# Altium schematic symbol library jlcpcb_2025_04_capacitors_extended_0201.schlib: 1175 symbols (part 2 of 7) (continued)
## CC0201KRX7R6BB103
designator C?  Capacitance: 10nF  (hidden comment: *)
Capacitor, Ceramic (MLCC), 10nF, ±10%, 10V, X7R, ±10%, SMD 0201; Manufacturer: YAGEO; Manufacturer Part Number: CC0201KRX7R6BB103; Package Size: 0201; JLCPCB Basic Part: No; JLCPCB Part Number: C541216; Supplier 1: LCSC; Category: Capacitors - MLCC; Supplier Part Number 1: C541216; Tolerance: ±10%; Voltage Rating: 10V; Temperature Coefficient: X7R; RoHS: Yes; ComponentLink1Description: Datasheet; ComponentLink1URL: https://wmsc.lcsc.com/wmsc/upload/file/pdf/v2/lcsc/2006151109_YAGEO-CC0201KRX7R6BB103_C541216.pdf; ComponentLink2Description: JLCPCB Part URL; ComponentLink2URL: https://jlcpcb.com/partdetail/C541216; ComponentLink3Description: LCSC Part URL; ComponentLink3URL: https://lcsc.com/product-detail/Multilayer-Ceramic-Capacitors-MLCC---SMD-SMT_YAGEO-YAGEO-CC0201KRX7R6BB103_C541216.html
footprint CAP-0201 (0201 (0603M) Capacitor)
pins: 1, 2

## CC0201KRX7R6BB152
designator C?  Capacitance: 1.5nF  (hidden comment: *)
Capacitor, Ceramic (MLCC), 1.5nF, ±10%, 10V, X7R, ±10%, SMD 0201; Manufacturer: YAGEO; Manufacturer Part Number: CC0201KRX7R6BB152; Package Size: 0201; JLCPCB Basic Part: No; JLCPCB Part Number: C541227; Supplier 1: LCSC; Category: Capacitors - MLCC; Supplier Part Number 1: C541227; Tolerance: ±10%; Voltage Rating: 10V; Temperature Coefficient: X7R; RoHS: Yes; ComponentLink1Description: Datasheet; ComponentLink1URL: https://wmsc.lcsc.com/wmsc/upload/file/pdf/v2/lcsc/2006151109_YAGEO-CC0201KRX7R6BB152_C541227.pdf; ComponentLink2Description: JLCPCB Part URL; ComponentLink2URL: https://jlcpcb.com/partdetail/C541227; ComponentLink3Description: LCSC Part URL; ComponentLink3URL: https://lcsc.com/product-detail/Multilayer-Ceramic-Capacitors-MLCC---SMD-SMT_YAGEO-YAGEO-CC0201KRX7R6BB152_C541227.html
footprint CAP-0201 (0201 (0603M) Capacitor)
pins: 1, 2

## CC0201KRX7R6BB332
designator C?  Capacitance: 3.3nF  (hidden comment: *)
Capacitor, Ceramic (MLCC), 3.3nF, ±10%, 10V, X7R, ±10%, SMD 0201; Manufacturer: YAGEO; Manufacturer Part Number: CC0201KRX7R6BB332; Package Size: 0201; JLCPCB Basic Part: No; JLCPCB Part Number: C526952; Supplier 1: LCSC; Category: Capacitors - MLCC; Supplier Part Number 1: C526952; Tolerance: ±10%; Voltage Rating: 10V; Temperature Coefficient: X7R; RoHS: Yes; ComponentLink1Description: Datasheet; ComponentLink1URL: https://wmsc.lcsc.com/wmsc/upload/file/pdf/v2/lcsc/2007091834_YAGEO-CC0201KRX7R6BB332_C526952.pdf; ComponentLink2Description: JLCPCB Part URL; ComponentLink2URL: https://jlcpcb.com/partdetail/C526952; ComponentLink3Description: LCSC Part URL; ComponentLink3URL: https://lcsc.com/product-detail/Multilayer-Ceramic-Capacitors-MLCC---SMD-SMT_YAGEO-YAGEO-CC0201KRX7R6BB332_C526952.html
footprint CAP-0201 (0201 (0603M) Capacitor)
pins: 1, 2

## CC0201KRX7R6BB392
designator C?  Capacitance: 3.9nF  (hidden comment: *)
Capacitor, Ceramic (MLCC), 3.9nF, ±10%, 10V, X7R, ±10%, SMD 0201; Manufacturer: YAGEO; Manufacturer Part Number: CC0201KRX7R6BB392; Package Size: 0201; JLCPCB Basic Part: No; JLCPCB Part Number: C526953; Supplier 1: LCSC; Category: Capacitors - MLCC; Supplier Part Number 1: C526953; Tolerance: ±10%; Voltage Rating: 10V; Temperature Coefficient: X7R; RoHS: Yes; ComponentLink1Description: Datasheet; ComponentLink1URL: https://wmsc.lcsc.com/wmsc/upload/file/pdf/v2/lcsc/2009180902_YAGEO-CC0201KRX7R6BB392_C526953.pdf; ComponentLink2Description: JLCPCB Part URL; ComponentLink2URL: https://jlcpcb.com/partdetail/C526953; ComponentLink3Description: LCSC Part URL; ComponentLink3URL: https://lcsc.com/product-detail/Multilayer-Ceramic-Capacitors-MLCC---SMD-SMT_YAGEO-YAGEO-CC0201KRX7R6BB392_C526953.html
footprint CAP-0201 (0201 (0603M) Capacitor)
pins: 1, 2

## CC0201KRX7R7BB102
designator C?  Capacitance: 1nF  (hidden comment: *)
Capacitor, Ceramic (MLCC), 1nF, ±10%, 16V, X7R, ±10%, SMD 0201; Manufacturer: YAGEO; Manufacturer Part Number: CC0201KRX7R7BB102; Package Size: 0201; JLCPCB Basic Part: No; JLCPCB Part Number: C541217; Supplier 1: LCSC; Category: Capacitors - MLCC; Supplier Part Number 1: C541217; Tolerance: ±10%; Voltage Rating: 16V; Temperature Coefficient: X7R; RoHS: Yes; ComponentLink1Description: Datasheet; ComponentLink1URL: https://wmsc.lcsc.com/wmsc/upload/file/pdf/v2/lcsc/2006151109_YAGEO-CC0201KRX7R7BB102_C541217.pdf; ComponentLink2Description: JLCPCB Part URL; ComponentLink2URL: https://jlcpcb.com/partdetail/C541217; ComponentLink3Description: LCSC Part URL; ComponentLink3URL: https://lcsc.com/product-detail/Multilayer-Ceramic-Capacitors-MLCC---SMD-SMT_YAGEO-YAGEO-CC0201KRX7R7BB102_C541217.html
footprint CAP-0201 (0201 (0603M) Capacitor)
pins: 1, 2

## CC0201KRX7R7BB103
designator C?  Capacitance: 10nF  (hidden comment: *)
Capacitor, Ceramic (MLCC), 10nF, ±10%, 16V, X7R, ±10%, SMD 0201; Manufacturer: YAGEO; Manufacturer Part Number: CC0201KRX7R7BB103; Package Size: 0201; JLCPCB Basic Part: No; JLCPCB Part Number: C272853; Supplier 1: LCSC; Category: Capacitors - MLCC; Supplier Part Number 1: C272853; Tolerance: ±10%; Voltage Rating: 16V; Temperature Coefficient: X7R; RoHS: Yes; ComponentLink1Description: Datasheet; ComponentLink1URL: https://wmsc.lcsc.com/wmsc/upload/file/pdf/v2/lcsc/2304140030_YAGEO-CC0201KRX7R7BB103_C272853.pdf; ComponentLink2Description: JLCPCB Part URL; ComponentLink2URL: https://jlcpcb.com/partdetail/C272853; ComponentLink3Description: LCSC Part URL; ComponentLink3URL: https://lcsc.com/product-detail/Multilayer-Ceramic-Capacitors-MLCC---SMD-SMT_YAGEO-YAGEO-CC0201KRX7R7BB103_C272853.html
footprint CAP-0201 (0201 (0603M) Capacitor)
pins: 1, 2

## CC0201KRX7R7BB272
designator C?  Capacitance: 2.7nF  (hidden comment: *)
Capacitor, Ceramic (MLCC), 2.7nF, ±10%, 16V, X7R, ±10%, SMD 0201; Manufacturer: YAGEO; Manufacturer Part Number: CC0201KRX7R7BB272; Package Size: 0201; JLCPCB Basic Part: No; JLCPCB Part Number: C327026; Supplier 1: LCSC; Category: Capacitors - MLCC; Supplier Part Number 1: C327026; Tolerance: ±10%; Voltage Rating: 16V; Temperature Coefficient: X7R; RoHS: Yes; ComponentLink1Description: Datasheet; ComponentLink1URL: https://wmsc.lcsc.com/wmsc/upload/file/pdf/v2/lcsc/1811061214_YAGEO-CC0201KRX7R7BB272_C327026.pdf; ComponentLink2Description: JLCPCB Part URL; ComponentLink2URL: https://jlcpcb.com/partdetail/C327026; ComponentLink3Description: LCSC Part URL; ComponentLink3URL: https://lcsc.com/product-detail/Multilayer-Ceramic-Capacitors-MLCC---SMD-SMT_YAGEO-YAGEO-CC0201KRX7R7BB272_C327026.html
footprint CAP-0201 (0201 (0603M) Capacitor)
pins: 1, 2

## CC0201KRX7R7BB331
designator C?  Capacitance: 330pF  (hidden comment: *)
Capacitor, Ceramic (MLCC), 330pF, ±10%, 16V, X7R, ±10%, SMD 0201; Manufacturer: YAGEO; Manufacturer Part Number: CC0201KRX7R7BB331; Package Size: 0201; JLCPCB Basic Part: No; JLCPCB Part Number: C541229; Supplier 1: LCSC; Category: Capacitors - MLCC; Supplier Part Number 1: C541229; Tolerance: ±10%; Voltage Rating: 16V; Temperature Coefficient: X7R; RoHS: Yes; ComponentLink1Description: Datasheet; ComponentLink1URL: https://wmsc.lcsc.com/wmsc/upload/file/pdf/v2/lcsc/2006151109_YAGEO-CC0201KRX7R7BB331_C541229.pdf; ComponentLink2Description: JLCPCB Part URL; ComponentLink2URL: https://jlcpcb.com/partdetail/C541229; ComponentLink3Description: LCSC Part URL; ComponentLink3URL: https://lcsc.com/product-detail/Multilayer-Ceramic-Capacitors-MLCC---SMD-SMT_YAGEO-YAGEO-CC0201KRX7R7BB331_C541229.html
footprint CAP-0201 (0201 (0603M) Capacitor)
pins: 1, 2

## CC0201KRX7R7BB392
designator C?  Capacitance: 3.9nF  (hidden comment: *)
Capacitor, Ceramic (MLCC), 3.9nF, ±10%, 16V, X7R, ±10%, SMD 0201; Manufacturer: YAGEO; Manufacturer Part Number: CC0201KRX7R7BB392; Package Size: 0201; JLCPCB Basic Part: No; JLCPCB Part Number: C541230; Supplier 1: LCSC; Category: Capacitors - MLCC; Supplier Part Number 1: C541230; Tolerance: ±10%; Voltage Rating: 16V; Temperature Coefficient: X7R; RoHS: Yes; ComponentLink1Description: Datasheet; ComponentLink1URL: https://wmsc.lcsc.com/wmsc/upload/file/pdf/v2/lcsc/2006151109_YAGEO-CC0201KRX7R7BB392_C541230.pdf; ComponentLink2Description: JLCPCB Part URL; ComponentLink2URL: https://jlcpcb.com/partdetail/C541230; ComponentLink3Description: LCSC Part URL; ComponentLink3URL: https://lcsc.com/product-detail/Multilayer-Ceramic-Capacitors-MLCC---SMD-SMT_YAGEO-YAGEO-CC0201KRX7R7BB392_C541230.html
footprint CAP-0201 (0201 (0603M) Capacitor)
pins: 1, 2

## CC0201KRX7R7BB472
designator C?  Capacitance: 4.7nF  (hidden comment: *)
Capacitor, Ceramic (MLCC), 4.7nF, ±10%, 16V, X7R, ±10%, SMD 0201; Manufacturer: YAGEO; Manufacturer Part Number: CC0201KRX7R7BB472; Package Size: 0201; JLCPCB Basic Part: No; JLCPCB Part Number: C526960; Supplier 1: LCSC; Category: Capacitors - MLCC; Supplier Part Number 1: C526960; Tolerance: ±10%; Voltage Rating: 16V; Temperature Coefficient: X7R; RoHS: Yes; ComponentLink1Description: Datasheet; ComponentLink1URL: https://wmsc.lcsc.com/wmsc/upload/file/pdf/v2/lcsc/2005222138_YAGEO-CC0201KRX7R7BB472_C526960.pdf; ComponentLink2Description: JLCPCB Part URL; ComponentLink2URL: https://jlcpcb.com/partdetail/C526960; ComponentLink3Description: LCSC Part URL; ComponentLink3URL: https://lcsc.com/product-detail/Multilayer-Ceramic-Capacitors-MLCC---SMD-SMT_YAGEO-YAGEO-CC0201KRX7R7BB472_C526960.html
footprint CAP-0201 (0201 (0603M) Capacitor)
pins: 1, 2

## CC0201KRX7R7BB562
designator C?  Capacitance: 5.6nF  (hidden comment: *)
Capacitor, Ceramic (MLCC), 5.6nF, ±10%, 16V, X7R, ±10%, SMD 0201; Manufacturer: YAGEO; Manufacturer Part Number: CC0201KRX7R7BB562; Package Size: 0201; JLCPCB Basic Part: No; JLCPCB Part Number: C327028; Supplier 1: LCSC; Category: Capacitors - MLCC; Supplier Part Number 1: C327028; Tolerance: ±10%; Voltage Rating: 16V; Temperature Coefficient: X7R; RoHS: Yes; ComponentLink1Description: Datasheet; ComponentLink1URL: https://wmsc.lcsc.com/wmsc/upload/file/pdf/v2/lcsc/1811061214_YAGEO-CC0201KRX7R7BB562_C327028.pdf; ComponentLink2Description: JLCPCB Part URL; ComponentLink2URL: https://jlcpcb.com/partdetail/C327028; ComponentLink3Description: LCSC Part URL; ComponentLink3URL: https://lcsc.com/product-detail/Multilayer-Ceramic-Capacitors-MLCC---SMD-SMT_YAGEO-YAGEO-CC0201KRX7R7BB562_C327028.html
footprint CAP-0201 (0201 (0603M) Capacitor)
pins: 1, 2

## CC0201KRX7R8BB102
designator C?  Capacitance: 1nF  (hidden comment: *)
Capacitor, Ceramic (MLCC), 1nF, ±10%, 25V, X7R, ±10%, SMD 0201; Manufacturer: YAGEO; Manufacturer Part Number: CC0201KRX7R8BB102; Package Size: 0201; JLCPCB Basic Part: No; JLCPCB Part Number: C272854; Supplier 1: LCSC; Category: Capacitors - MLCC; Supplier Part Number 1: C272854; Tolerance: ±10%; Voltage Rating: 25V; Temperature Coefficient: X7R; RoHS: Yes; ComponentLink1Description: Datasheet; ComponentLink1URL: https://wmsc.lcsc.com/wmsc/upload/file/pdf/v2/lcsc/2304140030_YAGEO-CC0201KRX7R8BB102_C272854.pdf; ComponentLink2Description: JLCPCB Part URL; ComponentLink2URL: https://jlcpcb.com/partdetail/C272854; ComponentLink3Description: LCSC Part URL; ComponentLink3URL: https://lcsc.com/product-detail/Multilayer-Ceramic-Capacitors-MLCC---SMD-SMT_YAGEO-YAGEO-CC0201KRX7R8BB102_C272854.html
footprint CAP-0201 (0201 (0603M) Capacitor)
pins: 1, 2

## CC0201KRX7R8BB103
designator C?  Capacitance: 10nF  (hidden comment: *)
Capacitor, Ceramic (MLCC), 10nF, ±10%, 25V, X7R, ±10%, SMD 0201; Manufacturer: YAGEO; Manufacturer Part Number: CC0201KRX7R8BB103; Package Size: 0201; JLCPCB Basic Part: No; JLCPCB Part Number: C326875; Supplier 1: LCSC; Category: Capacitors - MLCC; Supplier Part Number 1: C326875; Tolerance: ±10%; Voltage Rating: 25V; Temperature Coefficient: X7R; RoHS: Yes; ComponentLink1Description: Datasheet; ComponentLink1URL: https://wmsc.lcsc.com/wmsc/upload/file/pdf/v2/lcsc/2304140030_YAGEO-CC0201KRX7R8BB103_C326875.pdf; ComponentLink2Description: JLCPCB Part URL; ComponentLink2URL: https://jlcpcb.com/partdetail/C326875; ComponentLink3Description: LCSC Part URL; ComponentLink3URL: https://lcsc.com/product-detail/Multilayer-Ceramic-Capacitors-MLCC---SMD-SMT_YAGEO-YAGEO-CC0201KRX7R8BB103_C326875.html
footprint CAP-0201 (0201 (0603M) Capacitor)
pins: 1, 2

## CC0201KRX7R8BB152
designator C?  Capacitance: 1.5nF  (hidden comment: *)
Capacitor, Ceramic (MLCC), 1.5nF, ±10%, 25V, X7R, ±10%, SMD 0201; Manufacturer: YAGEO; Manufacturer Part Number: CC0201KRX7R8BB152; Package Size: 0201; JLCPCB Basic Part: No; JLCPCB Part Number: C505482; Supplier 1: LCSC; Category: Capacitors - MLCC; Supplier Part Number 1: C505482; Tolerance: ±10%; Voltage Rating: 25V; Temperature Coefficient: X7R; RoHS: Yes; ComponentLink1Description: Datasheet; ComponentLink1URL: https://wmsc.lcsc.com/wmsc/upload/file/pdf/v2/lcsc/2304140030_YAGEO-CC0201KRX7R8BB152_C505482.pdf; ComponentLink2Description: JLCPCB Part URL; ComponentLink2URL: https://jlcpcb.com/partdetail/C505482; ComponentLink3Description: LCSC Part URL; ComponentLink3URL: https://lcsc.com/product-detail/Multilayer-Ceramic-Capacitors-MLCC---SMD-SMT_YAGEO-YAGEO-CC0201KRX7R8BB152_C505482.html
footprint CAP-0201 (0201 (0603M) Capacitor)
pins: 1, 2

## CC0201KRX7R8BB472
designator C?  Capacitance: 4.7nF  (hidden comment: *)
Capacitor, Ceramic (MLCC), 4.7nF, ±10%, 25V, X7R, ±10%, SMD 0201; Manufacturer: YAGEO; Manufacturer Part Number: CC0201KRX7R8BB472; Package Size: 0201; JLCPCB Basic Part: No; JLCPCB Part Number: C309454; Supplier 1: LCSC; Category: Capacitors - MLCC; Supplier Part Number 1: C309454; Tolerance: ±10%; Voltage Rating: 25V; Temperature Coefficient: X7R; RoHS: Yes; ComponentLink1Description: Datasheet; ComponentLink1URL: https://wmsc.lcsc.com/wmsc/upload/file/pdf/v2/lcsc/2304140030_YAGEO-CC0201KRX7R8BB472_C309454.pdf; ComponentLink2Description: JLCPCB Part URL; ComponentLink2URL: https://jlcpcb.com/partdetail/C309454; ComponentLink3Description: LCSC Part URL; ComponentLink3URL: https://lcsc.com/product-detail/Multilayer-Ceramic-Capacitors-MLCC---SMD-SMT_YAGEO-YAGEO-CC0201KRX7R8BB472_C309454.html
footprint CAP-0201 (0201 (0603M) Capacitor)
pins: 1, 2

## CC0201KRX7R8BB682
designator C?  Capacitance: 6.8nF  (hidden comment: *)
Capacitor, Ceramic (MLCC), 6.8nF, ±10%, 25V, X7R, ±10%, SMD 0201; Manufacturer: YAGEO; Manufacturer Part Number: CC0201KRX7R8BB682; Package Size: 0201; JLCPCB Basic Part: No; JLCPCB Part Number: C505476; Supplier 1: LCSC; Category: Capacitors - MLCC; Supplier Part Number 1: C505476; Tolerance: ±10%; Voltage Rating: 25V; Temperature Coefficient: X7R; RoHS: Yes; ComponentLink1Description: Datasheet; ComponentLink1URL: https://wmsc.lcsc.com/wmsc/upload/file/pdf/v2/lcsc/2304140030_YAGEO-CC0201KRX7R8BB682_C505476.pdf; ComponentLink2Description: JLCPCB Part URL; ComponentLink2URL: https://jlcpcb.com/partdetail/C505476; ComponentLink3Description: LCSC Part URL; ComponentLink3URL: https://lcsc.com/product-detail/Multilayer-Ceramic-Capacitors-MLCC---SMD-SMT_YAGEO-YAGEO-CC0201KRX7R8BB682_C505476.html
footprint CAP-0201 (0201 (0603M) Capacitor)
pins: 1, 2

## CC0201KRX7R8BB821
designator C?  Capacitance: 820pF  (hidden comment: *)
Capacitor, Ceramic (MLCC), 820pF, ±10%, 25V, X7R, ±10%, SMD 0201; Manufacturer: YAGEO; Manufacturer Part Number: CC0201KRX7R8BB821; Package Size: 0201; JLCPCB Basic Part: No; JLCPCB Part Number: C327288; Supplier 1: LCSC; Category: Capacitors - MLCC; Supplier Part Number 1: C327288; Tolerance: ±10%; Voltage Rating: 25V; Temperature Coefficient: X7R; RoHS: Yes; ComponentLink1Description: Datasheet; ComponentLink1URL: https://wmsc.lcsc.com/wmsc/upload/file/pdf/v2/lcsc/2112151830_YAGEO-CC0201KRX7R8BB821_C327288.pdf; ComponentLink2Description: JLCPCB Part URL; ComponentLink2URL: https://jlcpcb.com/partdetail/C327288; ComponentLink3Description: LCSC Part URL; ComponentLink3URL: https://lcsc.com/product-detail/Multilayer-Ceramic-Capacitors-MLCC---SMD-SMT_YAGEO-YAGEO-CC0201KRX7R8BB821_C327288.html
footprint CAP-0201 (0201 (0603M) Capacitor)
pins: 1, 2

## CC0201KRX7R9BB101
designator C?  Capacitance: 100pF  (hidden comment: *)
Capacitor, Ceramic (MLCC), 100pF, ±10%, 50V, X7R, ±10%, SMD 0201; Manufacturer: YAGEO; Manufacturer Part Number: CC0201KRX7R9BB101; Package Size: 0201; JLCPCB Basic Part: No; JLCPCB Part Number: C576696; Supplier 1: LCSC; Category: Capacitors - MLCC; Supplier Part Number 1: C576696; Tolerance: ±10%; Voltage Rating: 50V; Temperature Coefficient: X7R; RoHS: Yes; ComponentLink1Description: Datasheet; ComponentLink1URL: https://wmsc.lcsc.com/wmsc/upload/file/pdf/v2/lcsc/2008131833_YAGEO-CC0201KRX7R9BB101_C576696.pdf; ComponentLink2Description: JLCPCB Part URL; ComponentLink2URL: https://jlcpcb.com/partdetail/C576696; ComponentLink3Description: LCSC Part URL; ComponentLink3URL: https://lcsc.com/product-detail/Multilayer-Ceramic-Capacitors-MLCC---SMD-SMT_YAGEO-YAGEO-CC0201KRX7R9BB101_C576696.html
footprint CAP-0201 (0201 (0603M) Capacitor)
pins: 1, 2

## CC0201KRX7R9BB102
designator C?  Capacitance: 1nF  (hidden comment: *)
Capacitor, Ceramic (MLCC), 1nF, ±10%, 50V, X7R, ±10%, SMD 0201; Manufacturer: YAGEO; Manufacturer Part Number: CC0201KRX7R9BB102; Package Size: 0201; JLCPCB Basic Part: No; JLCPCB Part Number: C505464; Supplier 1: LCSC; Category: Capacitors - MLCC; Supplier Part Number 1: C505464; Tolerance: ±10%; Voltage Rating: 50V; Temperature Coefficient: X7R; RoHS: Yes; ComponentLink1Description: Datasheet; ComponentLink1URL: https://wmsc.lcsc.com/wmsc/upload/file/pdf/v2/lcsc/2304140030_YAGEO-CC0201KRX7R9BB102_C505464.pdf; ComponentLink2Description: JLCPCB Part URL; ComponentLink2URL: https://jlcpcb.com/partdetail/C505464; ComponentLink3Description: LCSC Part URL; ComponentLink3URL: https://lcsc.com/product-detail/Multilayer-Ceramic-Capacitors-MLCC---SMD-SMT_YAGEO-YAGEO-CC0201KRX7R9BB102_C505464.html
footprint CAP-0201 (0201 (0603M) Capacitor)
pins: 1, 2

## CC0201KRX7R9BB121
designator C?  Capacitance: 120pF  (hidden comment: *)
Capacitor, Ceramic (MLCC), 120pF, ±10%, 50V, X7R, ±10%, SMD 0201; Manufacturer: YAGEO; Manufacturer Part Number: CC0201KRX7R9BB121; Package Size: 0201; JLCPCB Basic Part: No; JLCPCB Part Number: C505491; Supplier 1: LCSC; Category: Capacitors - MLCC; Supplier Part Number 1: C505491; Tolerance: ±10%; Voltage Rating: 50V; Temperature Coefficient: X7R; RoHS: Yes; ComponentLink1Description: Datasheet; ComponentLink1URL: https://wmsc.lcsc.com/wmsc/upload/file/pdf/v2/lcsc/2304140030_YAGEO-CC0201KRX7R9BB121_C505491.pdf; ComponentLink2Description: JLCPCB Part URL; ComponentLink2URL: https://jlcpcb.com/partdetail/C505491; ComponentLink3Description: LCSC Part URL; ComponentLink3URL: https://lcsc.com/product-detail/Multilayer-Ceramic-Capacitors-MLCC---SMD-SMT_YAGEO-YAGEO-CC0201KRX7R9BB121_C505491.html
footprint CAP-0201 (0201 (0603M) Capacitor)
pins: 1, 2

## CC0201KRX7R9BB470
designator C?  Capacitance: 47pF  (hidden comment: *)
Capacitor, Ceramic (MLCC), 47pF, ±10%, null, X7R, ±10%, SMD 0201; Manufacturer: YAGEO; Manufacturer Part Number: CC0201KRX7R9BB470; Package Size: 0201; JLCPCB Basic Part: No; JLCPCB Part Number: C576697; Supplier 1: LCSC; Category: Capacitors - MLCC; Supplier Part Number 1: C576697; Tolerance: ±10%; Voltage Rating: null; Temperature Coefficient: X7R; RoHS: Yes; ComponentLink1Description: Datasheet; ComponentLink1URL: https://wmsc.lcsc.com/wmsc/upload/file/pdf/v2/lcsc/2212091030_YAGEO-CC0201KRX7R9BB470_C576697.pdf; ComponentLink2Description: JLCPCB Part URL; ComponentLink2URL: https://jlcpcb.com/partdetail/C576697; ComponentLink3Description: LCSC Part URL; ComponentLink3URL: https://lcsc.com/product-detail/Multilayer-Ceramic-Capacitors-MLCC---SMD-SMT_YAGEO-YAGEO-CC0201KRX7R9BB470_C576697.html
footprint CAP-0201 (0201 (0603M) Capacitor)
pins: 1, 2

## CC0201MRX5R4BB105
designator C?  Capacitance: 1uF  (hidden comment: *)
Capacitor, Ceramic (MLCC), 1uF, ±20%, 4V, X5R, ±20%, SMD 0201; Manufacturer: YAGEO; Manufacturer Part Number: CC0201MRX5R4BB105; Package Size: 0201; JLCPCB Basic Part: No; JLCPCB Part Number: C2174409; Supplier 1: LCSC; Category: Capacitors - MLCC; Supplier Part Number 1: C2174409; Tolerance: ±20%; Voltage Rating: 4V; Temperature Coefficient: X5R; RoHS: Yes; ComponentLink1Description: Datasheet; ComponentLink1URL: https://wmsc.lcsc.com/wmsc/upload/file/pdf/v2/lcsc/2407081117_YAGEO-CC0201MRX5R4BB105_C2174409.pdf; ComponentLink2Description: JLCPCB Part URL; ComponentLink2URL: https://jlcpcb.com/partdetail/C2174409; ComponentLink3Description: LCSC Part URL; ComponentLink3URL: https://lcsc.com/product-detail/Multilayer-Ceramic-Capacitors-MLCC---SMD-SMT_YAGEO-YAGEO-CC0201MRX5R4BB105_C2174409.html
footprint CAP-0201 (0201 (0603M) Capacitor)
pins: 1, 2

## CC0201MRX5R4BB474
designator C?  Capacitance: 470nF  (hidden comment: *)
Capacitor, Ceramic (MLCC), 470nF, ±20%, 4V, X5R, ±20%, SMD 0201; Manufacturer: YAGEO; Manufacturer Part Number: CC0201MRX5R4BB474; Package Size: 0201; JLCPCB Basic Part: No; JLCPCB Part Number: C2168587; Supplier 1: LCSC; Category: Capacitors - MLCC; Supplier Part Number 1: C2168587; Tolerance: ±20%; Voltage Rating: 4V; Temperature Coefficient: X5R; RoHS: Yes; ComponentLink1Description: Datasheet; ComponentLink1URL: https://wmsc.lcsc.com/wmsc/upload/file/pdf/v2/lcsc/2407081117_YAGEO-CC0201MRX5R4BB474_C2168587.pdf; ComponentLink2Description: JLCPCB Part URL; ComponentLink2URL: https://jlcpcb.com/partdetail/C2168587; ComponentLink3Description: LCSC Part URL; ComponentLink3URL: https://lcsc.com/product-detail/Multilayer-Ceramic-Capacitors-MLCC---SMD-SMT_YAGEO-YAGEO-CC0201MRX5R4BB474_C2168587.html
footprint CAP-0201 (0201 (0603M) Capacitor)
pins: 1, 2

## CC0201MRX5R5BB104
designator C?  Capacitance: 100nF  (hidden comment: *)
Capacitor, Ceramic (MLCC), 100nF, ±20%, 6.3V, X5R, ±20%, SMD 0201; Manufacturer: YAGEO; Manufacturer Part Number: CC0201MRX5R5BB104; Package Size: 0201; JLCPCB Basic Part: No; JLCPCB Part Number: C277512; Supplier 1: LCSC; Category: Capacitors - MLCC; Supplier Part Number 1: C277512; Tolerance: ±20%; Voltage Rating: 6.3V; Temperature Coefficient: X5R; RoHS: Yes; ComponentLink1Description: Datasheet; ComponentLink1URL: https://wmsc.lcsc.com/wmsc/upload/file/pdf/v2/lcsc/2407081117_YAGEO-CC0201MRX5R5BB104_C277512.pdf; ComponentLink2Description: JLCPCB Part URL; ComponentLink2URL: https://jlcpcb.com/partdetail/C277512; ComponentLink3Description: LCSC Part URL; ComponentLink3URL: https://lcsc.com/product-detail/Multilayer-Ceramic-Capacitors-MLCC---SMD-SMT_YAGEO-YAGEO-CC0201MRX5R5BB104_C277512.html
footprint CAP-0201 (0201 (0603M) Capacitor)
pins: 1, 2

## CC0201MRX5R5BB105
designator C?  Capacitance: 1uF  (hidden comment: *)
Capacitor, Ceramic (MLCC), 1uF, ±20%, 6.3V, X5R, ±20%, SMD 0201; Manufacturer: YAGEO; Manufacturer Part Number: CC0201MRX5R5BB105; Package Size: 0201; JLCPCB Basic Part: No; JLCPCB Part Number: C272877; Supplier 1: LCSC; Category: Capacitors - MLCC; Supplier Part Number 1: C272877; Tolerance: ±20%; Voltage Rating: 6.3V; Temperature Coefficient: X5R; RoHS: Yes; ComponentLink1Description: Datasheet; ComponentLink1URL: https://wmsc.lcsc.com/wmsc/upload/file/pdf/v2/lcsc/2407081117_YAGEO-CC0201MRX5R5BB105_C272877.pdf; ComponentLink2Description: JLCPCB Part URL; ComponentLink2URL: https://jlcpcb.com/partdetail/C272877; ComponentLink3Description: LCSC Part URL; ComponentLink3URL: https://lcsc.com/product-detail/Multilayer-Ceramic-Capacitors-MLCC---SMD-SMT_YAGEO-YAGEO-CC0201MRX5R5BB105_C272877.html
footprint CAP-0201 (0201 (0603M) Capacitor)
pins: 1, 2

## CC0201MRX5R5BB225
designator C?  Capacitance: 2.2uF  (hidden comment: *)
Capacitor, Ceramic (MLCC), 2.2uF, ±20%, 6.3V, X5R, ±20%, SMD 0201; Manufacturer: YAGEO; Manufacturer Part Number: CC0201MRX5R5BB225; Package Size: 0201; JLCPCB Basic Part: No; JLCPCB Part Number: C2930550; Supplier 1: LCSC; Category: Capacitors - MLCC; Supplier Part Number 1: C2930550; Tolerance: ±20%; Voltage Rating: 6.3V; Temperature Coefficient: X5R; RoHS: Yes; ComponentLink1Description: Datasheet; ComponentLink1URL: https://wmsc.lcsc.com/wmsc/upload/file/pdf/v2/lcsc/2407081117_YAGEO-CC0201MRX5R5BB225_C2930550.pdf; ComponentLink2Description: JLCPCB Part URL; ComponentLink2URL: https://jlcpcb.com/partdetail/C2930550; ComponentLink3Description: LCSC Part URL; ComponentLink3URL: https://lcsc.com/product-detail/Multilayer-Ceramic-Capacitors-MLCC---SMD-SMT_YAGEO-YAGEO-CC0201MRX5R5BB225_C2930550.html
footprint CAP-0201 (0201 (0603M) Capacitor)
pins: 1, 2

## CC0201MRX5R6BB104
designator C?  Capacitance: 100nF  (hidden comment: *)
Capacitor, Ceramic (MLCC), 100nF, ±20%, 10V, X5R, ±20%, SMD 0201; Manufacturer: YAGEO; Manufacturer Part Number: CC0201MRX5R6BB104; Package Size: 0201; JLCPCB Basic Part: No; JLCPCB Part Number: C1853386; Supplier 1: LCSC; Category: Capacitors - MLCC; Supplier Part Number 1: C1853386; Tolerance: ±20%; Voltage Rating: 10V; Temperature Coefficient: X5R; RoHS: Yes; ComponentLink1Description: Datasheet; ComponentLink1URL: https://wmsc.lcsc.com/wmsc/upload/file/pdf/v2/lcsc/2407081117_YAGEO-CC0201MRX5R6BB104_C1853386.pdf; ComponentLink2Description: JLCPCB Part URL; ComponentLink2URL: https://jlcpcb.com/partdetail/C1853386; ComponentLink3Description: LCSC Part URL; ComponentLink3URL: https://lcsc.com/product-detail/Multilayer-Ceramic-Capacitors-MLCC---SMD-SMT_YAGEO-YAGEO-CC0201MRX5R6BB104_C1853386.html
footprint CAP-0201 (0201 (0603M) Capacitor)
pins: 1, 2

## CC0201MRX5R6BB105
designator C?  Capacitance: 1uF  (hidden comment: *)
Capacitor, Ceramic (MLCC), 1uF, ±20%, 10V, X5R, ±20%, SMD 0201; Manufacturer: YAGEO; Manufacturer Part Number: CC0201MRX5R6BB105; Package Size: 0201; JLCPCB Basic Part: No; JLCPCB Part Number: C605210; Supplier 1: LCSC; Category: Capacitors - MLCC; Supplier Part Number 1: C605210; Tolerance: ±20%; Voltage Rating: 10V; Temperature Coefficient: X5R; RoHS: Yes; ComponentLink1Description: Datasheet; ComponentLink1URL: https://wmsc.lcsc.com/wmsc/upload/file/pdf/v2/lcsc/2407081117_YAGEO-CC0201MRX5R6BB105_C605210.pdf; ComponentLink2Description: JLCPCB Part URL; ComponentLink2URL: https://jlcpcb.com/partdetail/C605210; ComponentLink3Description: LCSC Part URL; ComponentLink3URL: https://lcsc.com/product-detail/Multilayer-Ceramic-Capacitors-MLCC---SMD-SMT_YAGEO-YAGEO-CC0201MRX5R6BB105_C605210.html
footprint CAP-0201 (0201 (0603M) Capacitor)
pins: 1, 2

## CC0201MRX5R6BB225
designator C?  Capacitance: 2.2uF  (hidden comment: *)
Capacitor, Ceramic (MLCC), 2.2uF, ±20%, 10V, X5R, ±20%, SMD 0201; Manufacturer: YAGEO; Manufacturer Part Number: CC0201MRX5R6BB225; Package Size: 0201; JLCPCB Basic Part: No; JLCPCB Part Number: C2186869; Supplier 1: LCSC; Category: Capacitors - MLCC; Supplier Part Number 1: C2186869; Tolerance: ±20%; Voltage Rating: 10V; Temperature Coefficient: X5R; RoHS: Yes; ComponentLink1Description: Datasheet; ComponentLink1URL: https://wmsc.lcsc.com/wmsc/upload/file/pdf/v2/lcsc/2407081117_YAGEO-CC0201MRX5R6BB225_C2186869.pdf; ComponentLink2Description: JLCPCB Part URL; ComponentLink2URL: https://jlcpcb.com/partdetail/C2186869; ComponentLink3Description: LCSC Part URL; ComponentLink3URL: https://lcsc.com/product-detail/Multilayer-Ceramic-Capacitors-MLCC---SMD-SMT_YAGEO-YAGEO-CC0201MRX5R6BB225_C2186869.html
footprint CAP-0201 (0201 (0603M) Capacitor)
pins: 1, 2

## CC0201MRX5R7BB105
designator C?  Capacitance: 1uF  (hidden comment: *)
Capacitor, Ceramic (MLCC), 1uF, ±20%, 16V, X5R, ±20%, SMD 0201; Manufacturer: YAGEO; Manufacturer Part Number: CC0201MRX5R7BB105; Package Size: 0201; JLCPCB Basic Part: No; JLCPCB Part Number: C5182464; Supplier 1: LCSC; Category: Capacitors - MLCC; Supplier Part Number 1: C5182464; Tolerance: ±20%; Voltage Rating: 16V; Temperature Coefficient: X5R; RoHS: Yes; ComponentLink1Description: Datasheet; ComponentLink1URL: https://wmsc.lcsc.com/wmsc/upload/file/pdf/v2/lcsc/2407081117_YAGEO-CC0201MRX5R7BB105_C5182464.pdf; ComponentLink2Description: JLCPCB Part URL; ComponentLink2URL: https://jlcpcb.com/partdetail/C5182464; ComponentLink3Description: LCSC Part URL; ComponentLink3URL: https://lcsc.com/product-detail/Multilayer-Ceramic-Capacitors-MLCC---SMD-SMT_YAGEO-YAGEO-CC0201MRX5R7BB105_C5182464.html
footprint CAP-0201 (0201 (0603M) Capacitor)
pins: 1, 2

## CGA0201C0G2R0C500ET
designator C?  Capacitance: 2pF  (hidden comment: *)
Capacitor, Ceramic (MLCC), 2pF, 50V, C0G, SMD 0201; Manufacturer: HRE; Manufacturer Part Number: CGA0201C0G2R0C500ET; Package Size: 0201; JLCPCB Basic Part: No; JLCPCB Part Number: C22374842; Supplier 1: LCSC; Category: Capacitors - MLCC; Supplier Part Number 1: C22374842; Voltage Rating: 50V; Temperature Coefficient: C0G; RoHS: Yes; ComponentLink1Description: Datasheet; ComponentLink1URL: https://wmsc.lcsc.com/wmsc/upload/file/pdf/v2/lcsc/2404101552_HRE-CGA0201C0G2R0C500ET_C22374842.pdf; ComponentLink2Description: JLCPCB Part URL; ComponentLink2URL: https://jlcpcb.com/partdetail/C22374842; ComponentLink3Description: LCSC Part URL; ComponentLink3URL: https://lcsc.com/product-detail/Multilayer-Ceramic-Capacitors-MLCC---SMD-SMT_HRE-HRE-CGA0201C0G2R0C500ET_C22374842.html
footprint CAP-0201 (0201 (0603M) Capacitor)
pins: 1, 2

## CGA0201X5R104K100ET
designator C?  Capacitance: 100nF  (hidden comment: *)
Capacitor, Ceramic (MLCC), 100nF, ±10%, 10V, X5R, ±10%, SMD 0201; Manufacturer: HRE; Manufacturer Part Number: CGA0201X5R104K100ET; Package Size: 0201; JLCPCB Basic Part: No; JLCPCB Part Number: C6119757; Supplier 1: LCSC; Category: Capacitors - MLCC; Supplier Part Number 1: C6119757; Tolerance: ±10%; Voltage Rating: 10V; Temperature Coefficient: X5R; RoHS: Yes; ComponentLink1Description: Datasheet; ComponentLink2Description: JLCPCB Part URL; ComponentLink2URL: https://jlcpcb.com/partdetail/C6119757; ComponentLink3Description: LCSC Part URL; ComponentLink3URL: https://lcsc.com/product-detail/Multilayer-Ceramic-Capacitors-MLCC---SMD-SMT_HRE-HRE-CGA0201X5R104K100ET_C6119757.html
footprint CAP-0201 (0201 (0603M) Capacitor)
pins: 1, 2

## CGA0201X5R105K100ET
designator C?  Capacitance: 1000000pF  (hidden comment: *)
Capacitor, Ceramic (MLCC), 1000000pF, ±10%, 10V, X5R, ±10%, SMD 0201; Manufacturer: HRE; Manufacturer Part Number: CGA0201X5R105K100ET; Package Size: 0201; JLCPCB Basic Part: No; JLCPCB Part Number: C6119755; Supplier 1: LCSC; Category: Capacitors - MLCC; Supplier Part Number 1: C6119755; Tolerance: ±10%; Voltage Rating: 10V; Temperature Coefficient: X5R; RoHS: Yes; ComponentLink1Description: Datasheet; ComponentLink2Description: JLCPCB Part URL; ComponentLink2URL: https://jlcpcb.com/partdetail/C6119755; ComponentLink3Description: LCSC Part URL; ComponentLink3URL: https://lcsc.com/product-detail/Multilayer-Ceramic-Capacitors-MLCC---SMD-SMT_HRE-HRE-CGA0201X5R105K100ET_C6119755.html
footprint CAP-0201 (0201 (0603M) Capacitor)
pins: 1, 2

## CGA0201X5R105M160ET
designator C?  Capacitance: 1uF  (hidden comment: *)
Capacitor, Ceramic (MLCC), 1uF, ±20%, 16V, X5R, ±20%, SMD 0201; Manufacturer: HRE; Manufacturer Part Number: CGA0201X5R105M160ET; Package Size: 0201; JLCPCB Basic Part: No; JLCPCB Part Number: C6119756; Supplier 1: LCSC; Category: Capacitors - MLCC; Supplier Part Number 1: C6119756; Tolerance: ±20%; Voltage Rating: 16V; Temperature Coefficient: X5R; RoHS: Yes; ComponentLink1Description: Datasheet; ComponentLink2Description: JLCPCB Part URL; ComponentLink2URL: https://jlcpcb.com/partdetail/C6119756; ComponentLink3Description: LCSC Part URL; ComponentLink3URL: https://lcsc.com/product-detail/Multilayer-Ceramic-Capacitors-MLCC---SMD-SMT_HRE-HRE-CGA0201X5R105M160ET_C6119756.html
footprint CAP-0201 (0201 (0603M) Capacitor)
pins: 1, 2

## CGA0201X5R225K100ET
designator C?  Capacitance: 2.2uF  (hidden comment: *)
Capacitor, Ceramic (MLCC), 2.2uF, ±10%, 10V, X5R, ±10%, SMD 0201; Manufacturer: HRE; Manufacturer Part Number: CGA0201X5R225K100ET; Package Size: 0201; JLCPCB Basic Part: No; JLCPCB Part Number: C6119746; Supplier 1: LCSC; Category: Capacitors - MLCC; Supplier Part Number 1: C6119746; Tolerance: ±10%; Voltage Rating: 10V; Temperature Coefficient: X5R; RoHS: Yes; ComponentLink1Description: Datasheet; ComponentLink2Description: JLCPCB Part URL; ComponentLink2URL: https://jlcpcb.com/partdetail/C6119746; ComponentLink3Description: LCSC Part URL; ComponentLink3URL: https://lcsc.com/product-detail/Multilayer-Ceramic-Capacitors-MLCC---SMD-SMT_HRE-HRE-CGA0201X5R225K100ET_C6119746.html
footprint CAP-0201 (0201 (0603M) Capacitor)
pins: 1, 2

## CGA0201X5R474K6R3ET
designator C?  Capacitance: 470nF  (hidden comment: *)
Capacitor, Ceramic (MLCC), 470nF, ±10%, 6.3V, X5R, ±10%, SMD 0201; Manufacturer: HRE; Manufacturer Part Number: CGA0201X5R474K6R3ET; Package Size: 0201; JLCPCB Basic Part: No; JLCPCB Part Number: C6119747; Supplier 1: LCSC; Category: Capacitors - MLCC; Supplier Part Number 1: C6119747; Tolerance: ±10%; Voltage Rating: 6.3V; Temperature Coefficient: X5R; RoHS: Yes; ComponentLink1Description: Datasheet; ComponentLink2Description: JLCPCB Part URL; ComponentLink2URL: https://jlcpcb.com/partdetail/C6119747; ComponentLink3Description: LCSC Part URL; ComponentLink3URL: https://lcsc.com/product-detail/Multilayer-Ceramic-Capacitors-MLCC---SMD-SMT_HRE-HRE-CGA0201X5R474K6R3ET_C6119747.html
footprint CAP-0201 (0201 (0603M) Capacitor)
pins: 1, 2

## CGA0201X5R475M6R3ET
designator C?  Capacitance: 4.7uF  (hidden comment: *)
Capacitor, Ceramic (MLCC), 4.7uF, ±20%, 6.3V, X5R, ±20%, SMD 0201; Manufacturer: HRE; Manufacturer Part Number: CGA0201X5R475M6R3ET; Package Size: 0201; JLCPCB Basic Part: No; JLCPCB Part Number: C6119759; Supplier 1: LCSC; Category: Capacitors - MLCC; Supplier Part Number 1: C6119759; Tolerance: ±20%; Voltage Rating: 6.3V; Temperature Coefficient: X5R; RoHS: Yes; ComponentLink1Description: Datasheet; ComponentLink2Description: JLCPCB Part URL; ComponentLink2URL: https://jlcpcb.com/partdetail/C6119759; ComponentLink3Description: LCSC Part URL; ComponentLink3URL: https://lcsc.com/product-detail/Multilayer-Ceramic-Capacitors-MLCC---SMD-SMT_HRE-HRE-CGA0201X5R475M6R3ET_C6119759.html
footprint CAP-0201 (0201 (0603M) Capacitor)
pins: 1, 2

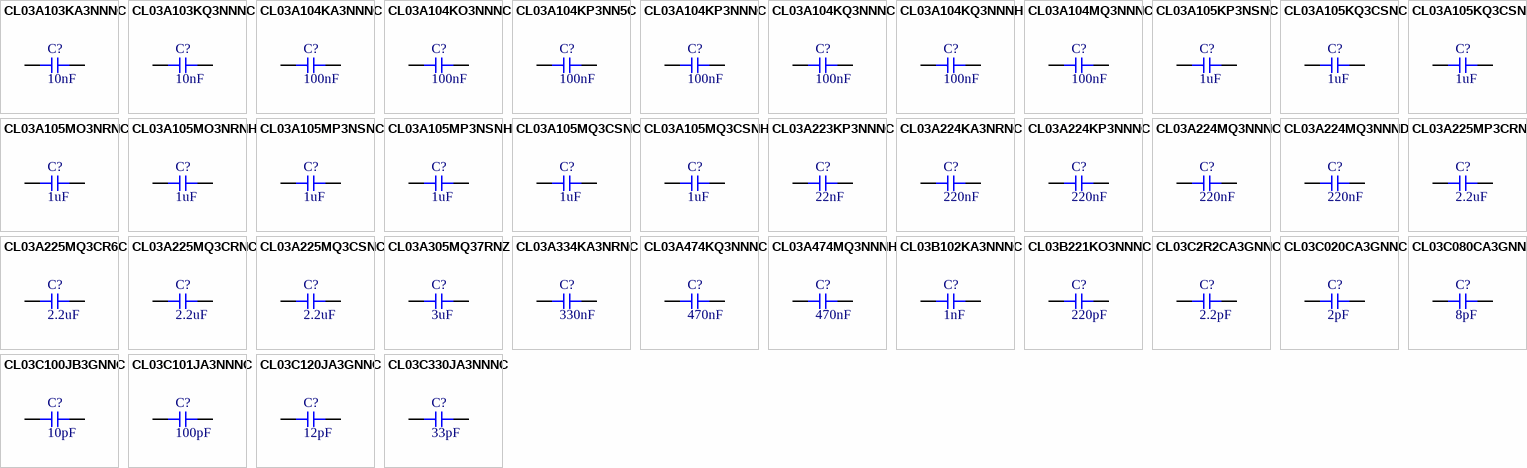
[diagram p9: symbols CL03A103KA3NNNC to CL03C330JA3NNNC]

## CL03A103KA3NNNC
designator C?  Capacitance: 10nF  (hidden comment: *)
Capacitor, Ceramic (MLCC), 10nF, ±10%, 25V, X5R, ±10%, SMD 0201; Manufacturer: Samsung Electro-Mechanics; Manufacturer Part Number: CL03A103KA3NNNC; Package Size: 0201; JLCPCB Basic Part: No; JLCPCB Part Number: C377732; Supplier 1: LCSC; Category: Capacitors - MLCC; Supplier Part Number 1: C377732; Tolerance: ±10%; Voltage Rating: 25V; Temperature Coefficient: X5R; RoHS: Yes; ComponentLink1Description: Datasheet; ComponentLink1URL: https://wmsc.lcsc.com/wmsc/upload/file/pdf/v2/lcsc/2304140030_Samsung-Electro-Mechanics-CL03A103KA3NNNC_C377732.pdf; ComponentLink2Description: JLCPCB Part URL; ComponentLink2URL: https://jlcpcb.com/partdetail/C377732; ComponentLink3Description: LCSC Part URL; ComponentLink3URL: https://lcsc.com/product-detail/Multilayer-Ceramic-Capacitors-MLCC---SMD-SMT_Samsung-Electro-Mechanics-Samsung-Electro-Mechanics-CL03A103KA3NNNC_C377732.html; ComponentLink4Description: Samsung Component Library; ComponentLink4URL: https://weblib.samsungsem.com/mlcc/mlcc-ec.do?partNumber=CL03A103KA3NNN
footprint CAP-0201 (0201 (0603M) Capacitor)
pins: 1, 2

## CL03A103KQ3NNNC
designator C?  Capacitance: 10nF  (hidden comment: *)
Capacitor, Ceramic (MLCC), 10nF, ±10%, 6.3V, X5R, ±10%, SMD 0201; Manufacturer: Samsung Electro-Mechanics; Manufacturer Part Number: CL03A103KQ3NNNC; Package Size: 0201; JLCPCB Basic Part: No; JLCPCB Part Number: C2991817; Supplier 1: LCSC; Category: Capacitors - MLCC; Supplier Part Number 1: C2991817; Tolerance: ±10%; Voltage Rating: 6.3V; Temperature Coefficient: X5R; RoHS: Yes; ComponentLink1Description: Datasheet; ComponentLink1URL: https://wmsc.lcsc.com/wmsc/upload/file/pdf/v2/lcsc/2204082030_Samsung-Electro-Mechanics-CL03A103KQ3NNNC_C2991817.pdf; ComponentLink2Description: JLCPCB Part URL; ComponentLink2URL: https://jlcpcb.com/partdetail/C2991817; ComponentLink3Description: LCSC Part URL; ComponentLink3URL: https://lcsc.com/product-detail/Multilayer-Ceramic-Capacitors-MLCC---SMD-SMT_Samsung-Electro-Mechanics-Samsung-Electro-Mechanics-CL03A103KQ3NNNC_C2991817.html; ComponentLink4Description: Samsung Component Library; ComponentLink4URL: https://weblib.samsungsem.com/mlcc/mlcc-ec.do?partNumber=CL03A103KQ3NNN
footprint CAP-0201 (0201 (0603M) Capacitor)
pins: 1, 2

## CL03A104KA3NNNC
designator C?  Capacitance: 100nF  (hidden comment: *)
Capacitor, Ceramic (MLCC), 100nF, ±10%, 25V, X5R, ±10%, SMD 0201; Manufacturer: Samsung Electro-Mechanics; Manufacturer Part Number: CL03A104KA3NNNC; Package Size: 0201; JLCPCB Basic Part: No; JLCPCB Part Number: C307379; Supplier 1: LCSC; Category: Capacitors - MLCC; Supplier Part Number 1: C307379; Tolerance: ±10%; Voltage Rating: 25V; Temperature Coefficient: X5R; RoHS: Yes; ComponentLink1Description: Datasheet; ComponentLink1URL: https://wmsc.lcsc.com/wmsc/upload/file/pdf/v2/lcsc/2304140030_Samsung-Electro-Mechanics-CL03A104KA3NNNC_C307379.pdf; ComponentLink2Description: JLCPCB Part URL; ComponentLink2URL: https://jlcpcb.com/partdetail/C307379; ComponentLink3Description: LCSC Part URL; ComponentLink3URL: https://lcsc.com/product-detail/Multilayer-Ceramic-Capacitors-MLCC---SMD-SMT_Samsung-Electro-Mechanics-Samsung-Electro-Mechanics-CL03A104KA3NNNC_C307379.html; ComponentLink4Description: Samsung Component Library; ComponentLink4URL: https://weblib.samsungsem.com/mlcc/mlcc-ec.do?partNumber=CL03A104KA3NNN
footprint CAP-0201 (0201 (0603M) Capacitor)
pins: 1, 2

## CL03A104KO3NNNC
designator C?  Capacitance: 100nF  (hidden comment: *)
Capacitor, Ceramic (MLCC), 100nF, ±10%, 16V, X5R, ±10%, SMD 0201; Manufacturer: Samsung Electro-Mechanics; Manufacturer Part Number: CL03A104KO3NNNC; Package Size: 0201; JLCPCB Basic Part: No; JLCPCB Part Number: C307380; Supplier 1: LCSC; Category: Capacitors - MLCC; Supplier Part Number 1: C307380; Tolerance: ±10%; Voltage Rating: 16V; Temperature Coefficient: X5R; RoHS: Yes; ComponentLink1Description: Datasheet; ComponentLink1URL: https://wmsc.lcsc.com/wmsc/upload/file/pdf/v2/lcsc/2304140030_Samsung-Electro-Mechanics-CL03A104KO3NNNC_C307380.pdf; ComponentLink2Description: JLCPCB Part URL; ComponentLink2URL: https://jlcpcb.com/partdetail/C307380; ComponentLink3Description: LCSC Part URL; ComponentLink3URL: https://lcsc.com/product-detail/Multilayer-Ceramic-Capacitors-MLCC---SMD-SMT_Samsung-Electro-Mechanics-Samsung-Electro-Mechanics-CL03A104KO3NNNC_C307380.html; ComponentLink4Description: Samsung Component Library; ComponentLink4URL: https://weblib.samsungsem.com/mlcc/mlcc-ec.do?partNumber=CL03A104KO3NNN
footprint CAP-0201 (0201 (0603M) Capacitor)
pins: 1, 2

## CL03A104KP3NN5C
designator C?  Capacitance: 100nF  (hidden comment: *)
Capacitor, Ceramic (MLCC), 100nF, ±10%, 10V, X5R, ±10%, SMD 0201; Manufacturer: Samsung Electro-Mechanics; Manufacturer Part Number: CL03A104KP3NN5C; Package Size: 0201; JLCPCB Basic Part: No; JLCPCB Part Number: C307382; Supplier 1: LCSC; Category: Capacitors - MLCC; Supplier Part Number 1: C307382; Tolerance: ±10%; Voltage Rating: 10V; Temperature Coefficient: X5R; RoHS: Yes; ComponentLink1Description: Datasheet; ComponentLink1URL: https://wmsc.lcsc.com/wmsc/upload/file/pdf/v2/lcsc/2304140030_Samsung-Electro-Mechanics-CL03A104KP3NN5C_C307382.pdf; ComponentLink2Description: JLCPCB Part URL; ComponentLink2URL: https://jlcpcb.com/partdetail/C307382; ComponentLink3Description: LCSC Part URL; ComponentLink3URL: https://lcsc.com/product-detail/Multilayer-Ceramic-Capacitors-MLCC---SMD-SMT_Samsung-Electro-Mechanics-Samsung-Electro-Mechanics-CL03A104KP3NN5C_C307382.html; ComponentLink4Description: Samsung Component Library; ComponentLink4URL: https://weblib.samsungsem.com/mlcc/mlcc-ec.do?partNumber=CL03A104KP3NN5
footprint CAP-0201 (0201 (0603M) Capacitor)
pins: 1, 2

## CL03A104KP3NNNC
designator C?  Capacitance: 100nF  (hidden comment: *)
Capacitor, Ceramic (MLCC), 100nF, ±10%, 10V, X5R, ±10%, SMD 0201; Manufacturer: Samsung Electro-Mechanics; Manufacturer Part Number: CL03A104KP3NNNC; Package Size: 0201; JLCPCB Basic Part: No; JLCPCB Part Number: C49062; Supplier 1: LCSC; Category: Capacitors - MLCC; Supplier Part Number 1: C49062; Tolerance: ±10%; Voltage Rating: 10V; Temperature Coefficient: X5R; RoHS: Yes; ComponentLink1Description: Datasheet; ComponentLink1URL: https://wmsc.lcsc.com/wmsc/upload/file/pdf/v2/lcsc/2304140030_Samsung-Electro-Mechanics-CL03A104KP3NNNC_C49062.pdf; ComponentLink2Description: JLCPCB Part URL; ComponentLink2URL: https://jlcpcb.com/partdetail/C49062; ComponentLink3Description: LCSC Part URL; ComponentLink3URL: https://lcsc.com/product-detail/Multilayer-Ceramic-Capacitors-MLCC---SMD-SMT_Samsung-Electro-Mechanics-Samsung-Electro-Mechanics-CL03A104KP3NNNC_C49062.html; ComponentLink4Description: Samsung Component Library; ComponentLink4URL: https://weblib.samsungsem.com/mlcc/mlcc-ec.do?partNumber=CL03A104KP3NNN
footprint CAP-0201 (0201 (0603M) Capacitor)
pins: 1, 2

## CL03A104KQ3NNNC
designator C?  Capacitance: 100nF  (hidden comment: *)
Capacitor, Ceramic (MLCC), 100nF, ±10%, 6.3V, X5R, ±10%, SMD 0201; Manufacturer: Samsung Electro-Mechanics; Manufacturer Part Number: CL03A104KQ3NNNC; Package Size: 0201; JLCPCB Basic Part: No; JLCPCB Part Number: C160831; Supplier 1: LCSC; Category: Capacitors - MLCC; Supplier Part Number 1: C160831; Tolerance: ±10%; Voltage Rating: 6.3V; Temperature Coefficient: X5R; RoHS: Yes; ComponentLink1Description: Datasheet; ComponentLink1URL: https://wmsc.lcsc.com/wmsc/upload/file/pdf/v2/lcsc/2304140030_Samsung-Electro-Mechanics-CL03A104KQ3NNNC_C160831.pdf; ComponentLink2Description: JLCPCB Part URL; ComponentLink2URL: https://jlcpcb.com/partdetail/C160831; ComponentLink3Description: LCSC Part URL; ComponentLink3URL: https://lcsc.com/product-detail/Multilayer-Ceramic-Capacitors-MLCC---SMD-SMT_Samsung-Electro-Mechanics-Samsung-Electro-Mechanics-CL03A104KQ3NNNC_C160831.html; ComponentLink4Description: Samsung Component Library; ComponentLink4URL: https://weblib.samsungsem.com/mlcc/mlcc-ec.do?partNumber=CL03A104KQ3NNN
footprint CAP-0201 (0201 (0603M) Capacitor)
pins: 1, 2

## CL03A104KQ3NNNH
designator C?  Capacitance: 100nF  (hidden comment: *)
Capacitor, Ceramic (MLCC), 100nF, ±10%, 6.3V, X5R, ±10%, SMD 0201; Manufacturer: Samsung Electro-Mechanics; Manufacturer Part Number: CL03A104KQ3NNNH; Package Size: 0201; JLCPCB Basic Part: No; JLCPCB Part Number: C170154; Supplier 1: LCSC; Category: Capacitors - MLCC; Supplier Part Number 1: C170154; Tolerance: ±10%; Voltage Rating: 6.3V; Temperature Coefficient: X5R; RoHS: Yes; ComponentLink1Description: Datasheet; ComponentLink1URL: https://wmsc.lcsc.com/wmsc/upload/file/pdf/v2/lcsc/2304140030_Samsung-Electro-Mechanics-CL03A104KQ3NNNH_C170154.pdf; ComponentLink2Description: JLCPCB Part URL; ComponentLink2URL: https://jlcpcb.com/partdetail/C170154; ComponentLink3Description: LCSC Part URL; ComponentLink3URL: https://lcsc.com/product-detail/Multilayer-Ceramic-Capacitors-MLCC---SMD-SMT_Samsung-Electro-Mechanics-Samsung-Electro-Mechanics-CL03A104KQ3NNNH_C170154.html; ComponentLink4Description: Samsung Component Library; ComponentLink4URL: https://weblib.samsungsem.com/mlcc/mlcc-ec.do?partNumber=CL03A104KQ3NNN
footprint CAP-0201 (0201 (0603M) Capacitor)
pins: 1, 2

## CL03A104MQ3NNNC
designator C?  Capacitance: 100nF  (hidden comment: *)
Capacitor, Ceramic (MLCC), 100nF, ±20%, 6.3V, X5R, ±20%, SMD 0201; Manufacturer: Samsung Electro-Mechanics; Manufacturer Part Number: CL03A104MQ3NNNC; Package Size: 0201; JLCPCB Basic Part: No; JLCPCB Part Number: C307384; Supplier 1: LCSC; Category: Capacitors - MLCC; Supplier Part Number 1: C307384; Tolerance: ±20%; Voltage Rating: 6.3V; Temperature Coefficient: X5R; RoHS: Yes; ComponentLink1Description: Datasheet; ComponentLink1URL: https://wmsc.lcsc.com/wmsc/upload/file/pdf/v2/lcsc/2304140030_Samsung-Electro-Mechanics-CL03A104MQ3NNNC_C307384.pdf; ComponentLink2Description: JLCPCB Part URL; ComponentLink2URL: https://jlcpcb.com/partdetail/C307384; ComponentLink3Description: LCSC Part URL; ComponentLink3URL: https://lcsc.com/product-detail/Multilayer-Ceramic-Capacitors-MLCC---SMD-SMT_Samsung-Electro-Mechanics-Samsung-Electro-Mechanics-CL03A104MQ3NNNC_C307384.html; ComponentLink4Description: Samsung Component Library; ComponentLink4URL: https://weblib.samsungsem.com/mlcc/mlcc-ec.do?partNumber=CL03A104MQ3NNN
footprint CAP-0201 (0201 (0603M) Capacitor)
pins: 1, 2

## CL03A105KP3NSNC
designator C?  Capacitance: 1uF  (hidden comment: *)
Capacitor, Ceramic (MLCC), 1uF, ±10%, 10V, X5R, ±10%, SMD 0201; Manufacturer: Samsung Electro-Mechanics; Manufacturer Part Number: CL03A105KP3NSNC; Package Size: 0201; JLCPCB Basic Part: No; JLCPCB Part Number: C5209398; Supplier 1: LCSC; Category: Capacitors - MLCC; Supplier Part Number 1: C5209398; Tolerance: ±10%; Voltage Rating: 10V; Temperature Coefficient: X5R; RoHS: Yes; ComponentLink1Description: Datasheet; ComponentLink1URL: https://wmsc.lcsc.com/wmsc/upload/file/pdf/v2/lcsc/2309061403_Samsung-Electro-Mechanics-CL03A105KP3NSNC_C5209398.pdf; ComponentLink2Description: JLCPCB Part URL; ComponentLink2URL: https://jlcpcb.com/partdetail/C5209398; ComponentLink3Description: LCSC Part URL; ComponentLink3URL: https://lcsc.com/product-detail/Multilayer-Ceramic-Capacitors-MLCC---SMD-SMT_Samsung-Electro-Mechanics-Samsung-Electro-Mechanics-CL03A105KP3NSNC_C5209398.html; ComponentLink4Description: Samsung Component Library; ComponentLink4URL: https://weblib.samsungsem.com/mlcc/mlcc-ec.do?partNumber=CL03A105KP3NSN
footprint CAP-0201 (0201 (0603M) Capacitor)
pins: 1, 2

## CL03A105KQ3CSNC
designator C?  Capacitance: 1uF  (hidden comment: *)
Capacitor, Ceramic (MLCC), 1uF, ±10%, 6.3V, X5R, ±10%, SMD 0201; Manufacturer: Samsung Electro-Mechanics; Manufacturer Part Number: CL03A105KQ3CSNC; Package Size: 0201; JLCPCB Basic Part: No; JLCPCB Part Number: C318541; Supplier 1: LCSC; Category: Capacitors - MLCC; Supplier Part Number 1: C318541; Tolerance: ±10%; Voltage Rating: 6.3V; Temperature Coefficient: X5R; RoHS: Yes; ComponentLink1Description: Datasheet; ComponentLink1URL: https://wmsc.lcsc.com/wmsc/upload/file/pdf/v2/lcsc/2304140030_Samsung-Electro-Mechanics-CL03A105KQ3CSNC_C318541.pdf; ComponentLink2Description: JLCPCB Part URL; ComponentLink2URL: https://jlcpcb.com/partdetail/C318541; ComponentLink3Description: LCSC Part URL; ComponentLink3URL: https://lcsc.com/product-detail/Multilayer-Ceramic-Capacitors-MLCC---SMD-SMT_Samsung-Electro-Mechanics-Samsung-Electro-Mechanics-CL03A105KQ3CSNC_C318541.html; ComponentLink4Description: Samsung Component Library; ComponentLink4URL: https://weblib.samsungsem.com/mlcc/mlcc-ec.do?partNumber=CL03A105KQ3CSN
footprint CAP-0201 (0201 (0603M) Capacitor)
pins: 1, 2